# Altium footprint library RDM_ALT_PCB.PcbLib: 171 footprints (part 9 of 11)
Each footprint in its own frame and in the unit in brackets; x right, y up, seen from the top. Pads: shape width x height; smd on the part's side, far side on the other; paste and mask are expansions set on the pad; w line width, h text height; cw(c..) or ccw(c..) is an arc to the next point about the centre after c.
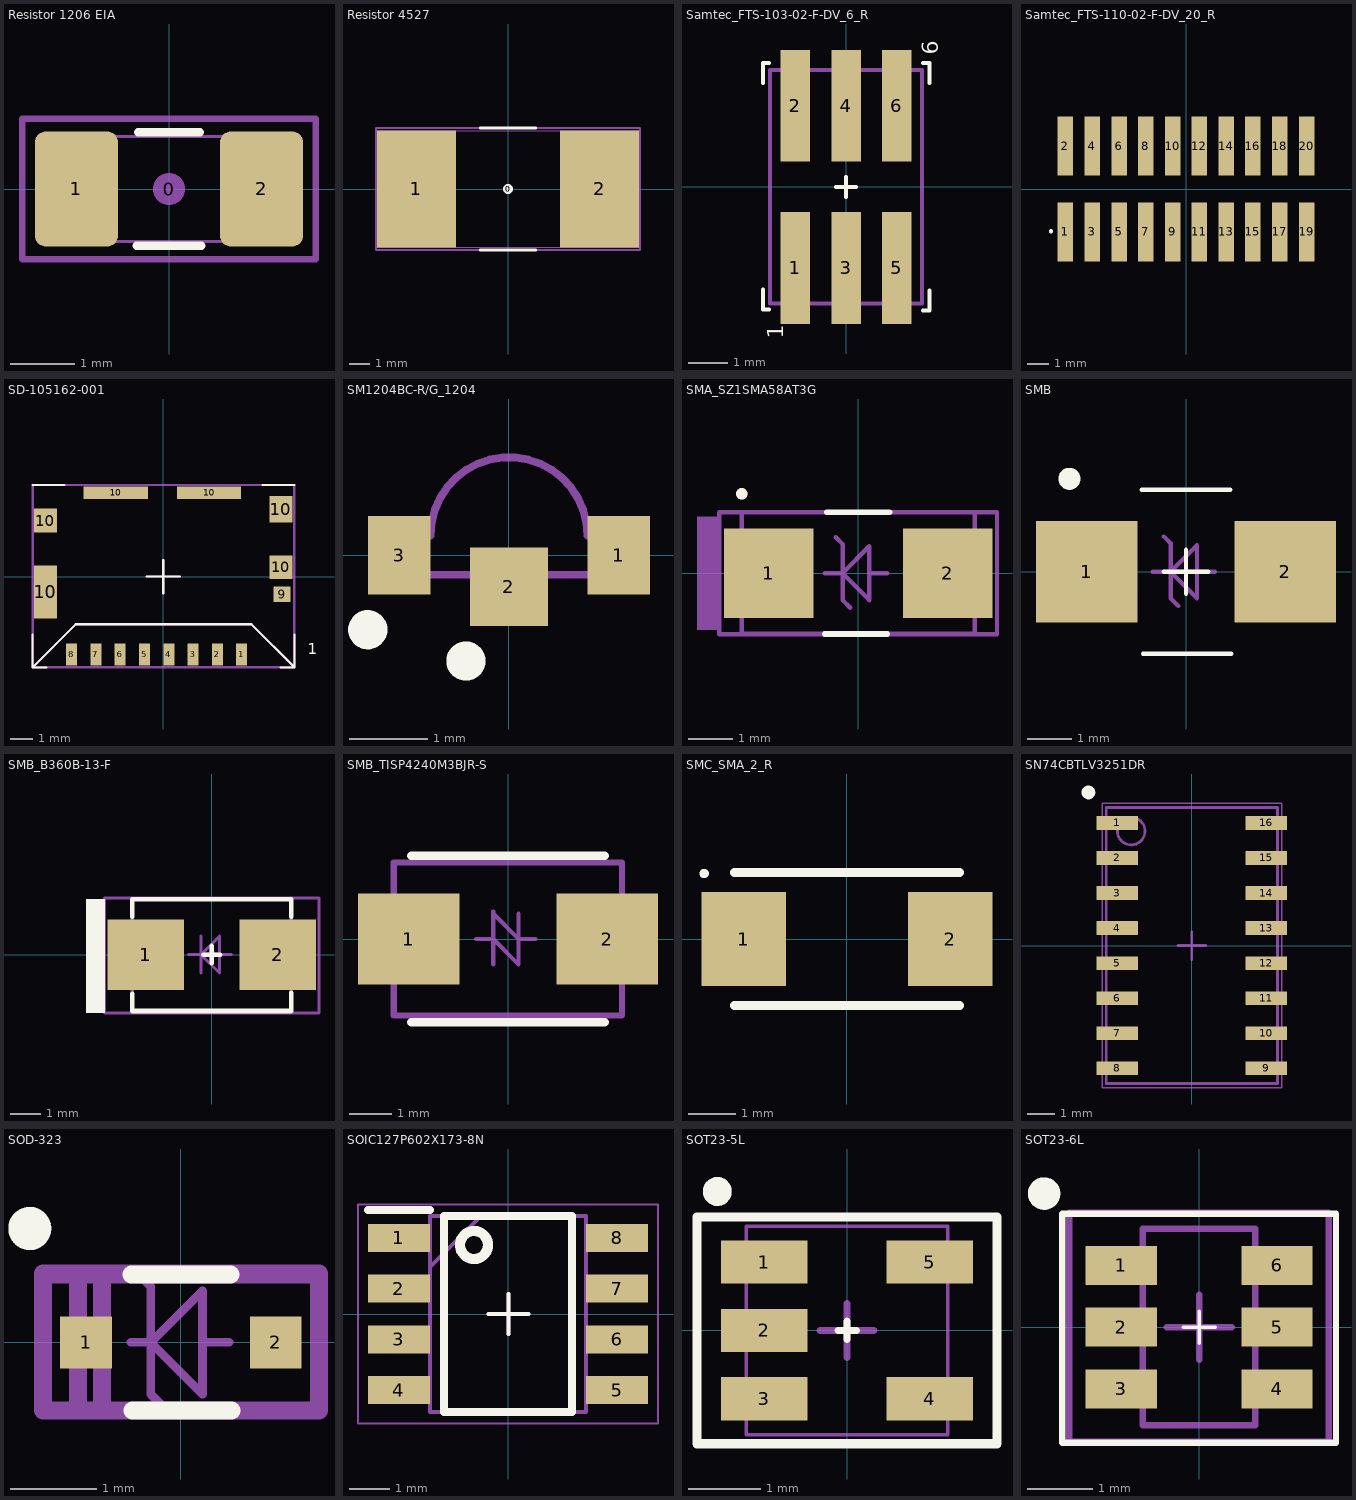
[diagram p8: the footprints below, top view; thin cyan lines are the x and y axes]

## Resistor 1206 EIA [mm]
pads (3):
  round 0.508 on Mech15: 0(0,0)
  rrect25% 1.3x1.8 smd: 1(-1.45,0) 2(1.45,0)
Top Overlay:
  lines w0.127: -0.508,-0.889 0.508,-0.889 ; -0.483,0.889 0.483,0.889
Mechanical 13:
  lines w0.05: 1.025,-0.824 -1.025,-0.824 1.025,-0.824 ; -1.625,-0.825 -1.625,0.825 -1.025,0.825 -1.025,-0.825 -1.625,-0.825 ; -1.025,0.824 1.025,0.824 -1.025,0.824 ; 1.025,-0.825 1.625,-0.825 1.625,0.825 1.025,0.825 1.025,-0.825
Mechanical 15:
  lines w0.1: -2.3,-1.1 2.3,-1.1 2.3,1.1 -2.3,1.1 -2.3,-1.1
3D body "RES 1206 (3216 metric).STEP": height 0.69, standoff -0.01, extent -1.625,-0.825 1.625,0.825

## Resistor 4527 [mm] "Current Meas Shunt Resistor"
pads (5):
  round 0.508 on Mech15: 0(0,0)
  round 0.508 on Mech13: 0(0,0)
  round 0.508 on Top Overlay: 0(0,0)
  rect 3.94x5.84 smd: 1(-4.575,0) 2(4.575,0)
Top Overlay:
  lines w0.127: -1.392,-3.048 1.392,-3.048 ; -1.392,3.048 1.392,3.048
Mechanical 13:
  lines w0.05: -4.826,2.921 -4.785,-2.921 ; 4.785,-2.922 4.826,2.921 ; -6.604,-2.921 -6.604,2.921 -3.121,2.921 -1.025,2.921 1.025,2.921 6.604,2.921 6.604,-2.921 1.025,-2.921 -1.025,-2.921 -6.604,-2.921
Mechanical 15:
  lines w0.1: -6.604,-3.048 6.604,-3.048 6.604,3.048 -6.604,3.048 -6.604,-3.048
3D body "vishay_Shunt_5W.stp": height 2.43, standoff 0.01, extent -5.78,-3.493 5.78,3.493

## Samtec_FTS-103-02-F-DV_6_R [mil] "Samtec_FTS-103-02-F-DV_6_R"
height 125
pads (6):
  rect 29x110 smd mask+2: 1(-50,-80) 2(-50,80) 3(0,-80) 4(0,80) 5(50,-80) 6(50,80)
Top Overlay:
  lines w3.94: -82,-120.99 -76,-121 ; -81.99,-120.84 -81.99,-101.16 ; -82,102.16 -82,122.01 -76,122 ; -9.84,0 9.85,0 ; 0,-9.84 0,9.84 ; 76,-122 82,-122.01 82,-102.16 ; 76,122 82,121.99 82,102.16
  text "1" at -62,-150 h15.75
  text "6" at 91,130 h15.75
Mechanical 13:
  lines w3.94: -9.84,0 9.85,0 ; 0,-9.84 0,9.84 ; -74.99,-114.99 -74.99,115 75.01,115 75.01,-114.99 -74.99,-114.99
Mechanical 15:
  lines w3.94: -9.84,0 9.85,0 ; 0,-9.84 0,9.84 ; -74.99,-114.99 75.01,-114.99 75.01,115 -74.99,115 -74.99,-114.99
3D body "FTS-103-02-F-DV.stp": height 125, standoff 0, extent -74.99,-114.99 75.01,115

## Samtec_FTS-110-02-F-DV_20_R [mil] "Samtec_FTS-110-02-F-DV_20_R"
height 125
pads (20):
  rect 29x110 smd mask+2: 1(-225,-80) 2(-225,80) 3(-175,-80) 4(-175,80) 5(-125,-80) 6(-125,80) 7(-75,-80) 8(-75,80) 9(-25,-80) 10(-25,80) 11(25,-80) 12(25,80) 13(75,-80) 14(75,80) 15(125,-80) 16(125,80) 17(175,-80) 18(175,80) 19(225,-80) 20(225,80)
Top Overlay:
  circle w7.87: c-251.97,-78.74 r0
3D body "FTS-110-02-F-DV.stp": height 125, standoff 0, extent -249.99,-114.99 250.01,115

## SD-105162-001 [mm] "Molex microSD Card Con SMT Right Angle"
pads (15):
  rect 0.5x1 smd: 1(3.55,-3.531) 2(2.45,-3.531) 3(1.35,-3.531) 4(0.25,-3.531) 5(-0.85,-3.531) 6(-1.95,-3.531) 7(-3.05,-3.531) 8(-4.15,-3.531)
  rect 0.78x0.72 smd: 9(5.379,-0.801)
  rect 1.05x2.39 smd: 10(-5.34,-0.701)
  rect 1.05x1.1 smd: 10(-5.34,2.534)
  rect 2.91x0.55 smd: 10(-2.15,3.794) 10(2.075,3.794)
  rect 1.05x1.05 smd: 10(5.328,0.419)
  rect 1.05x1.2 smd: 10(5.328,3.048)
Top Overlay:
  lines w0.1: -5.918,-4.115 -5.283,-4.115 ; -5.918,-2.642 -5.918,-4.109 -3.969,-2.159 3.988,-2.159 5.944,-4.115 ; -5.918,4.14 -4.47,4.14 ; -0.75,0 0.75,0 ; 0,-0.762 0,0.738 ; 4.496,4.14 5.944,4.14 ; 5.309,-4.115 5.944,-4.115 ; 5.944,-2.642 5.944,-4.115
  text "1" at 6.553,-3.531 h0.5
Mechanical 13:
  lines w0.1: -0.75,0 0.75,0 ; 0,-0.762 0,0.738
Mechanical 15:
  lines w0.1: -5.905,-4.106 -3.959,-2.159 3.998,-2.159 5.935,-4.096 ; -0.75,0 0.75,0 ; 0,-0.762 0,0.738 ; -5.915,-4.106 -5.915,4.14 5.935,4.14 5.935,-4.106 -5.915,-4.106
3D body "1051620001.stp": height 1.38, standoff -0.07, extent -5.65,-3.805 5.65,3.795

## SM1204BC-R/G_1204 [mm]
pads (3):
  rect 0.8x1 smd: 1(1.4,0) 3(-1.4,0)
  rect 1x1 smd: 2(0,-0.4)
Top Overlay:
  circle w0.25: c-0.55,-1.35 r0.125
  circle w0.25: c-1.8,-0.95 r0.125
Mechanical 13:
  lines w0.1: -1.6,-0.25 -1.6,0.25 -1,0.25 cw(c0,0.25) 1,0.25 1.6,0.25 1.6,-0.25 -1.6,-0.25
3D body: height 1, standoff 0, extent -1,0.25 1,1.212
3D body: height 1, standoff 0, extent -1.6,-0.25 1.6,0.25
3D body: height 0.25, standoff 0, extent -0.55,1.7 -0.55,1.7
3D body: height 0.25, standoff 0, extent -0.35,1.75 -0.35,1.75

## SMA_SZ1SMA58AT3G [mm] "TVS - Diodes DO-214AC, SMA"
height 2.6
pads (2):
  rect 2x2 smd: 1(-2,0) 2(2,0)
Top Overlay:
  circle w0.254: c-2.6,1.77 r0
  lines w0.127: -0.75,-1.36 0.65,-1.36 ; -0.7,1.36 0.7,1.36
Mechanical 1:
  circle w0.254: c-2.6,1.77 r0
Mechanical 13:
  rectangle: -3.6,-1.27 -3.1,1.27
  pour cut-out: -3.546,1.77
  lines w0.1: -2.6,-1.35 -2.6,1.36 2.6,1.36 2.6,-1.35 -2.6,-1.35
Mechanical 15:
  circle w0.254: c-2.6,1.77 r0
  rectangle: -3.6,-1.27 -3.1,1.27
  lines w0.1: -0.75,0 -0.35,0 ; -0.5,0.8 -0.35,0.65 -0.35,0.6 -0.35,-0.6 -0.175,-0.775 ; 0.25,0 0.65,0 ; -3.1,-1.36 -3.1,-1.36 ; -3.1,-1.36 -3.1,1.36 3.1,1.36 3.1,-1.36 -3.1,-1.36 ; -0.35,0 0.25,0.6 0.25,-0.6 -0.35,0
3D body "DO-214AC SMA.step": height 2.4, standoff 0, extent -2.6,-1.3 2.6,1.3

## SMB [mm] "DO-214-AA/SMB; 2 C-Bend Leads; Body 5.3 x 3.6 mm, inc. leads (LxW)"
height 2.54
pads (2):
  rect 2.3x2.3 smd: 1(-2.25,0) 2(2.25,0)
Top Overlay:
  circle w0.3: c-2.642,2.108 r0.1
  lines w0.1: -1,1.861 1,1.861 ; -0.975,-1.854 1.025,-1.854 ; -0.5,0 0.5,0 ; 0,-0.5 0,0.5
Mechanical 1:
  lines w0.1: -0.2,0 0.2,0 ; 0,-0.2 0,0.2
Mechanical 15:
  lines w0.1: -0.75,0 -0.35,0 ; -0.5,0.8 -0.35,0.65 -0.35,0.6 -0.35,-0.6 -0.175,-0.775 ; 0.25,0 0.65,0 ; -0.35,0 0.25,0.6 0.25,-0.6 -0.35,0
3D body "SMBJ58CA-13-F--3DModel-STEP-56544.STEP": height 2.24, standoff -0.26, extent -2.648,-1.81 2.648,1.81

## SMB_B360B-13-F [mm] "Diode Schottky DO-214AC (SMA)"
height 2.54
pads (2):
  rect 2.5x2.3 smd: 1(-2.15,0) 2(2.15,0)
Top Overlay:
  rectangle: -4.1,-1.91 -3.48,1.82
  lines w0.15: -2.6,-1.28 -2.6,-1.84 2.6,-1.84 2.6,-1.24 ; -2.6,1.24 -2.6,1.81 2.6,1.81 2.6,1.23 ; -0.28,0 0.28,0 ; 0,-0.28 0,0.28
Mechanical 1:
  lines w0.1: -0.2,0 0.2,0 ; 0,-0.2 0,0.2
Mechanical 13:
  rectangle: -4.1,-1.91 -3.48,1.82
  lines w0.11: -2.6,1.81 -2.6,1.81 ; -2.6,1.81 -2.6,-1.84 2.589,-1.84 2.589,1.81 -2.6,1.81
  lines w0.15: -0.28,0 0.28,0 ; 0,-0.28 0,0.28
Mechanical 15:
  circle w0.254: c0,0 r0.001
  rectangle: -4.1,-1.91 -3.48,1.82
  pour cut-out: -6.29,2.93
  lines w0.1: -0.75,0 -0.35,0 ; -0.35,-0.6 -0.35,0.6 ; 0.25,0 0.65,0 ; -0.35,0 0.25,-0.6 0.25,0.6 -0.35,0 ; -3.5,-1.9 3.5,-1.9 3.5,1.85 -3.5,1.85 -3.5,-1.9
3D body "SMBJ58CA-13-F--3DModel-STEP-56544.STEP": height 2.31, standoff -0.19, extent -2.648,-1.81 2.647,1.81

## SMB_TISP4240M3BJR-S [mm] "SMB_TISP4240M3BJR-S"
height 2.4
pads (2):
  rect 2.4x2.16 smd: 1(-2.35,0) 2(2.35,0)
Top Overlay:
  lines w0.2: -2.285,-1.97 2.285,-1.97 ; -2.285,1.97 2.285,1.97
Mechanical 13:
  lines w0.15: -2.7,-1.81 -2.7,1.81 2.7,1.81 2.7,-1.81 -2.7,-1.81
Mechanical 15:
  lines w0.01: -2.7,-1.81 2.7,-1.81
  lines w0.1: -0.75,0 -0.35,0 0.25,-0.6 0.25,0.6 ; -0.35,-0.6 -0.35,0.6 ; -0.35,0.65 -0.35,0.6 ; 0.65,0 0.25,0 -0.35,0.6
3D body "tisp4240m3bj.stp": height 2.13, standoff 0, extent -2.7,-1.81 2.7,1.81

## SMC_SMA_2_R [mm] "SMC_SMA_2_R"
height 2.95
pads (2):
  rect 1.8x2 smd: 1(-2.2,0) 2(2.2,0)
Top Overlay:
  circle w0.2: c-3.048,1.397 r0
  lines w0.2: -2.4,-1.42 2.4,-1.42 ; -2.4,1.42 2.4,1.42
3D body "DO-214 SMA.STEP": height 2.4, standoff 0, extent -2.6,-1.3 2.6,1.3

## SN74CBTLV3251DR [mm] "16-SOIC"
pads (16):
  rect 1.5x0.5 smd: 1(-2.7,4.445) 2(-2.7,3.175) 3(-2.7,1.905) 4(-2.7,0.635) 5(-2.7,-0.635) 6(-2.7,-1.905) 7(-2.7,-3.175) 8(-2.7,-4.445) 9(2.7,-4.445) 10(2.7,-3.175) 11(2.7,-1.905) 12(2.7,-0.635) 13(2.7,0.635) 14(2.7,1.905) 15(2.7,3.175) 16(2.7,4.445)
Top Overlay:
  circle w0.25: c-3.75,5.55 r0.125
Mechanical 13:
  circle w0.1: c-2.2,4.15 r0.5
  lines w0.1: -3.1,-5 3.099,-5 3.099,5 -3.1,5 -3.1,-5
Mechanical 15:
  lines w0.05: -3.25,-5.15 3.25,-5.15 3.25,5.15 -3.25,5.15 -3.25,-5.15
  lines w0.1: -0.5,0 0.5,0 ; 0,-0.5 0,0.5
3D body "D16.stp": height 1.76, standoff 0, extent -3.099,-5.004 3.099,5.004

## SOD-323 [mm] "SOD-323 SMD Zener  PDZ3.0B,115"
height 2.6
pads (2):
  rect 0.6x0.6 smd: 1(-1.1,0) 2(1.1,0)
Top Overlay:
  circle w0.25: c-1.753,1.321 r0.125
  lines w0.21: -0.572,0.787 0.572,0.787 ; -0.559,-0.787 0.584,-0.787
Mechanical 13:
  lines w0.21: -1.194,-0.787 -1.194,0.787 ; -0.914,-0.787 -0.914,0.787 ; -1.6,-0.787 1.6,-0.787 1.6,0.787 -1.6,0.787 -1.6,-0.787
Mechanical 15:
  lines w0.1: -0.584,0 -0.325,0 ; -0.5,0.8 -0.35,0.65 -0.35,0.6 -0.35,-0.6 -0.175,-0.775 ; 0.25,0 0.559,0 ; -0.35,0 0.25,-0.6 0.25,0.6 -0.35,0
  lines w0.21: -1.6,-0.787 -1.6,0.8 1.6,0.8 1.6,-0.787 -1.6,-0.787
3D body "Zener_3V-SOD-323F.STEP": height 0.79, standoff -0.08, extent -1.35,-0.675 1.35,0.675

## SOIC127P602X173-8N [mm]
pads (8):
  rect 1.55x0.7 smd: 1(-2.725,1.905) 2(-2.725,0.635) 3(-2.725,-0.635) 4(-2.725,-1.905) 5(2.725,-1.905) 6(2.725,-0.635) 7(2.725,0.635) 8(2.725,1.905)
Top Overlay:
  circle w0.254: c-0.85,1.725 r0.35
  lines w0.1: -0.492,0 0.508,0 ; 0.008,-0.5 0.008,0.5
  lines w0.2: -3.5,2.605 -1.95,2.605 ; -1.6,-2.445 -1.6,2.445 1.6,2.445 1.6,-2.445 -1.6,-2.445
Mechanical 13:
  lines w0.1: -0.492,0 0.508,0 ; 0.008,-0.5 0.008,0.5
Mechanical 15:
  lines w0.05: -3.75,-2.739 3.75,-2.739 3.75,2.739 -3.75,2.739 -3.75,-2.739
  lines w0.1: -1.95,1.175 -0.68,2.445 ; -0.492,0 0.508,0 ; 0.008,-0.5 0.008,0.5 ; -1.95,-2.445 -1.95,2.445 1.95,2.445 1.95,-2.445 -1.95,-2.445
3D body "NCP1092DG.stp": height 1.73, standoff 0, extent -3.01,-2.445 3.01,2.445

## SOT23-5L [mm] "STMPS2151STR, TPS7A0522PDBVT"
pads (5):
  rect 1.2x0.6 smd: 1(-1.15,0.949) 2(-1.15,-0.001) 3(-1.15,-0.951) 4(1.15,-0.951) 5(1.15,0.949)
Top Overlay:
  circle w0.2: c-1.803,1.93 r0.1
  lines w0.1: -0.127,0 0.127,0 ; 0,-0.127 0,0.127
  lines w0.127: -2.086,-1.575 2.083,-1.575 2.083,1.575 -2.086,1.575 -2.086,-1.575
Mechanical 13:
  circle w0.2: c-1.803,1.93 r0.1
  lines w0.05: -1.4,-1.451 -1.4,1.449 1.4,1.449 1.4,-1.451 -1.4,-1.451
  lines w0.1: -0.375,-0.001 0.375,-0.001 ; 0,-0.376 0,0.374
Mechanical 15:
  circle w0.2: c-1.803,1.93 r0.1
  lines w0.05: -1.4,-1.451 -1.4,1.449 1.4,1.449 1.4,-1.451 -1.4,-1.451
  lines w0.1: -0.375,-0.001 0.375,-0.001 ; 0,-0.376 0,0.374
3D body "SOT33-5L_STMPS2151STR_3D_Model.STEP": height -2.02, standoff -3.47, extent -1.4,-1.45 1.4,1.45

## SOT23-6L [mm] "ESDA6V1BC6"
height 1.25
pads (6):
  rect 1.1x0.6 smd: 1(-1.2,0.95) 2(-1.2,0) 3(-1.2,-0.95) 4(1.2,-0.95) 5(1.2,0) 6(1.2,0.95)
Top Overlay:
  circle w0.25: c-2.388,2.057 r0.125
  lines w0.05: -0.25,0 0.25,0 ; 0,-0.25 0,0.25
  lines w0.1: -2.108,-1.778 2.108,-1.778 2.108,1.748 -2.108,1.748 -2.108,-1.778
Mechanical 13:
  lines w0.05: -0.5,0 0.5,0 ; 0,-0.5 0,0.5
  lines w0.1: -0.865,-1.515 0.865,-1.515 0.865,1.515 -0.865,1.515 -0.865,-1.515
Mechanical 15:
  lines w0.1: -0.5,0 0.5,0 ; 0,-0.5 0,0.5 ; -2,-1.763 2,-1.763 2,1.763 -2,1.763 -2,-1.763
3D body: height 1.25, standoff 0.05, extent -0.865,-1.515 0.865,1.515